# Altium schematic symbol library SCHLIB.SchLib: 2608 symbols (part 3 of 20) (continued)
## CON-FFC-16POS-RA (continued)
footprint CON-FFC-16X1-1MM
pins: 1, 2, 3, 4, 5, 6, 7, 8, 9, 10, 11, 12, 13, 14, 15, 16, 17 27, 18

## CON-FPC-20POS-0.5MM
designator J?, comment 0.5MM
CONN FFC TOP 20POS 0.5MM SMD R/A; Manufacturer: Wurth Electronics; Manufacturer Part Number: 687120183622; Actuator Material: Nylon,Polyamide; Wire/Cable Type: Straight; Number of Positions: 20; Current Rating: 400mA; Supplier 1: Digi-Key; Supplier Part Number 1: 732-11341-1-ND; Stock: 3090; Pricing: 1=2.31, 10=1.93, 100=1.69, 1000=1.54 (USD); RoHS: No; Mount: Surface Mount; Contact Material: Bronze; Contact Plating: Tin; Housing Material: Polymer; Housing Color: Beige; Min Operating Temperature: -25°C; Max Operating Temperature: 85°C; Packaging: Tape and Reel; Termination: Solder; Mating Cycles: 20; Flammability Rating: UL94 V-0; ComponentLink1URL: https://media.digikey.com/pdf/Data%20Sheets/Wurth%20Electronics%20PDFs/WR-FPC_FFC_Flyer.pdf?src-supplier=Digi-Key; ComponentLink1Description: https://media.digikey.com/pdf/Data%20Sheets/Wurth%20Electronics%20PDFs/WR-FPC_FFC_Flyer.pdf?src-supplier=Digi-Key; ComponentLink2URL: https://katalog.we-online.de/em/datasheet/687120183622.pdf?src-supplier=Digi-Key; ComponentLink2Description: https://katalog.we-online.de/em/datasheet/687120183622.pdf?src-supplier=Digi-Key
footprint CON-FPC-20POS-0.5MM (ZIF Connectors, Horizontal, Top Contact Low Profile, pitch 0.5mm, 20p)
pins: 1, 2, 3, 4, 5, 6, 7, 8, 9, 10, 11, 12, 13, 14, 15, 16, 17, 18, 19, 20, MP1, MP2

## CON-FPC-31POS-0.5MM
designator J?, comment 0.5MM
CONN FPC TOP 31POS 0.50MM R/A; Manufacturer: Amphenol FCI; Manufacturer Part Number: SFV31R-4STE1HLF; Actuator Material: Glass,Polyphenylene; Voltage Rating: 50V; Current Rating: 500mA; Number of Positions: 31; Insulation Resistance: 100MR; Pitch: 0.02inch; Supplier 1: Digi-Key; Supplier Part Number 1: SFV31R-4STE1HLF-ND; Stock: 0; Pricing: 6000=0.2513 (USD); RoHS: Yes; Mount: Surface Mount; Housing Material: Polymer; Contact Material: Bronze; Contact Plating: Tin; Min Operating Temperature: -55°C; Max Operating Temperature: 105°C; Package Quantity: 3000; Packaging: Tape and Reel; Termination: Solder; Contact Location: Top; Flammability Rating: UL94 V-0; ComponentLink1URL: https://datasheet.ciiva.com/18563/10117319-18563813.pdf?src-supplier=Digi-Key; ComponentLink1Description: https://datasheet.ciiva.com/18563/10117319-18563813.pdf?src-supplier=Digi-Key
pins: 1, 2, 3, 4, 5, 6, 7, 8, 9, 10, 11, 12, 13, 14, 15, 16, 17, 18, 19, 20, 21, 22, 23, 24, 25, 26, 27, 28, 29, 30, 31, MP1, MP2

## CON-FPC-35POS-0.5MM
designator J?, comment 0.5MM
CONN FFC TOP 35POS 0.50MM R/A; Manufacturer: Amphenol FCI; Manufacturer Part Number: SFV35R-2STBE1HLF; Actuator Material: Glass,Polyphenylene; Number of Positions: 35; Insulation Resistance: 100MR; Wire/Cable Type: Straight; Voltage Rating: 50V; Current Rating: 500mA; Supplier 1: Mouser; Supplier Part Number 1: 649-SFV35R-2STBE1HLF; Stock: 5813; Pricing: 1=0.6, 10=0.443, 100=0.424, 500=0.369, 1000=0.304, 3000=0.277 (USD); RoHS: Yes; Mount: Surface Mount; Contact Material: Bronze; Contact Plating: Gold; Housing Material: Polymer; Min Operating Temperature: -55°C; Max Operating Temperature: 105°C; Termination: Solder; Contact Location: Top; Packaging: Tape and Reel; Number of Rows: 1; Package Quantity: 3000; Orientation: Right Angle; Pitch: 0.5mm; Flammability Rating: UL94 V-0; ComponentLink1URL: https://datasheet.ciiva.com/15249/ecatalogappnamecatdisplaystyledomproductquerynamesfv35r-2stbe1hlf-15249059.pdf?src-supplier=Arrow+Europe; ComponentLink1Description: https://datasheet.ciiva.com/15249/ecatalogappnamecatdisplaystyledomproductquerynamesfv35r-2stbe1hlf-15249059.pdf?src-supplier=Arrow+Europe; ComponentLink2URL: https://datasheet.ciiva.com/48769/sfv12b-hlf-48769990.pdf?src-supplier=Avnet; ComponentLink2Description: https://datasheet.ciiva.com/48769/sfv12b-hlf-48769990.pdf?src-supplier=Avnet
footprint CON-FPC-35POS-0.5mm (FPC Connector, 35-Leads, Right Angle, Pitch 0.5 mm, Mated Height 2.0 mm, SMT)
pins: 1, 2, 3, 4, 5, 6, 7, 8, 9, 10, 11, 12, 13, 14, 15, 16, 17, 18, 19, 20, 21, 22, 23, 24, 25, 26, 27, 28, 29, 30, 31, 32, 33, 34, 35, 36, 37, MP1, MP2

## CON-FPC-39POS-0.3mm
designator J?, comment 39POS
CONN FPC BOTTOM 39POS 0.30MM R/A; Manufacturer: Amphenol FCI; Manufacturer Part Number: 10061122-391420HLF; Actuator Material: Thermoplastic; Number of Contacts: 39; Voltage Rating: 30V; Current Rating: 200mA; Contact Resistance: 100mR; Pitch: 0.3mm; Supplier 1: Digi-Key; Supplier Part Number 1: 609-10061122-391420HLFCT-ND; Stock: 4998; Pricing: 1=0.49, 10=0.461, 25=0.4152, 50=0.3692, 100=0.3537, 250=0.323, 500=0.3076, 1000=0.2538, 2500=0.2307 (USD); RoHS: Yes; Mount: Surface Mount; Housing Color: Black; Contact Material: Copper Alloy; Housing Material: Thermoplastic; Contact Plating: Gold; Min Operating Temperature: -55°C; Max Operating Temperature: 85°C; Orientation: Right Angle; Termination: Solder; Number of Rows: 1; Number of Positions: 39; Packaging: Tape and Reel; Package Quantity: 5000; Length: 13.5mm; Depth: 3.5mm; Radiation Hardening: No; Flammability Rating: UL94 V-0; ComponentLink1URL: https://datasheet.ciiva.com/10369/10061122-10369232.pdf?src-supplier=Avnet; ComponentLink1Description: https://datasheet.ciiva.com/10369/10061122-10369232.pdf?src-supplier=Avnet; ComponentLink2URL: https://datasheet.ciiva.com/18491/10061122-18491997.pdf?src-supplier=Digi-Key; ComponentLink2Description: https://datasheet.ciiva.com/18491/10061122-18491997.pdf?src-supplier=Digi-Key
footprint CON-FPC-39POS-0.3mm (FPC Connector, 39-Leads, Right Angle, Pitch 0.3 mm, Mated Height 0.9 mm, SMT)
pins: 1, 2, 3, 4, 5, 6, 7, 8, 9, 10, 11, 12, 13, 14, 15, 16, 17, 18, 19, 20, 21, 22, 23, 24, 25, 26, 27, 28, 29, 30, 31, 32, 33, 34, 35, 36, 37, 38, 39, MP1, MP2

## CON-FPC-40POS-0.5MM
designator J?, comment 0.5MM
CONN FFC BOTTOM 40POS 0.50MM R/A; Manufacturer: Molex; Manufacturer Part Number: DS1020-09-40VBT1A; Actuator Material: Glass,Polyphenylene; Contact Resistance: 20mR; Current Rating: 500mA; Voltage Rating: 50V; Number of Positions: 40; Wire/Cable Type: Straight; Mating Cycles: 20; Supplier 1: Digi-Key; Supplier Part Number 1: WM3436CT-ND; Stock: 15140; Pricing: 1=2.15, 10=1.954, 25=1.8344, 50=1.7548, 100=1.675, 250=1.5154, 500=1.3958 (USD); RoHS: Yes; Mount: Surface Mount; Contact Material: Bronze; Contact Plating: Gold; Housing Color: Black; Housing Material: Nylon; Min Operating Temperature: -20°C; Max Operating Temperature: 85°C; Number of Rows: 1; Packaging: Tape and Reel; Package Quantity: 1; Termination: Solder; Number of Contacts: 40; Orientation: Right Angle; Length: 25.5mm; Pitch: 0.5mm; Depth: 5.6mm; Flammability Rating: UL94 V-0; ComponentLink1URL: https://datasheet.ciiva.com/671/541323062-sd-671324.pdf?src-supplier=Digi-Key; ComponentLink1Description: https://datasheet.ciiva.com/671/541323062-sd-671324.pdf?src-supplier=Digi-Key; ComponentLink2URL: https://datasheet.ciiva.com/671/541324062-sd-671416.pdf?src-supplier=Digi-Key; ComponentLink2Description: https://datasheet.ciiva.com/671/541324062-sd-671416.pdf?src-supplier=Digi-Key; ComponentLink3URL: https://datasheet.ciiva.com/671/541324062-sd-671417.pdf?src-supplier=Digi-Key; ComponentLink3Description: https://datasheet.ciiva.com/671/541324062-sd-671417.pdf?src-supplier=Digi-Key
footprint CON-FPC-40P-0.5MM (FPC Connector, 40-Leads, Right Angle, Pitch 0.5 mm, Mated Height 2.0 mm, SMT)
pins: 1, 2, 3, 4, 5, 6, 7, 8, 9, 10, 11, 12, 13, 14, 15, 16, 17, 18, 19, 20, 21, 22, 23, 24, 25, 26, 27, 28, 29, 30, 31, 32, 33, 34, 35, 36, 37, 38, 39, 40, MP1, MP2

## CON-HDMI-2086581001
designator J?, comment HDMI  (value not drawn)
CONN RCPT HDMI 19POS SMD R/A; Part Description: 0.5mm Pitch, Surface Mount Right Angle 19 Contacts HDMI Receptacle With Thru Hole Mounting Pads; Manufacturer: MOLEX; Manufacturer Part Number: 2086581001; PressFit: No; Component Kind: Standard; Component Type: Standard; Footprint: MOLEX_47151-0001; Pin Count: 20; Family: HDMI; Mounted: Yes; Socket: No; SMD: Yes; Sense: No; Status: None; ComponentHeight: 6.18mm; Author: CERN DEM JLC
footprint MOLEX_47151-0001
pins: 1 (io), 2 (io), 3 (io), 4 (io), 5 (io), 6 (io), 7 (io), 8 (io), 9 (io), 10 (io), 11 (io), 12 (io), 13 (io), 14 (io), 15 (io), 16 (io), 17 (io), 18 (io), 19 (io), SHIELD (power)

## CON-HEADER 1X7-2.54MM
designator J?, comment 2.54MM
CON HEADER 1X7 2.54MM PITCH; Washability: OK
footprint CON-HEADER-1X7-2.54MM
pins: 1 GND_IN, 2, 3, 4, 5, 6, 7

## CON-HEADER-1X4-2.54MM
designator J?, comment 2.54MM
CON HEADER 1X4 2.54MM PITCH; Washability: OK
footprint CON-HEADER-1X4-2.54MM
pins: 1 GND_IN, 2, 3, 4

## CON-HEADER-24POS-2MM-RA
designator J?, comment 2MM
CONN HEADER R/A 24POS 2MM; Manufacturer: Sullins; Manufacturer Part Number: NRPN401PARN-RC; Connector Type: Male Pin; Number of Positions: 40; Pitch: 0.079inch; Washability: OK; Supplier 1: Digi-Key; Stock 1: 2838; Pricing 1: 1=2,38000, 10=2,13000, 100=1,75390, 500=1,38644, 1000=1,20640 (USD); RoHS: Yes; Mount: Through Hole; Color: Black; Contact Plating: Gold; Package Quantity: 1000; Number of Rows: 1; Packaging: Bulk; Termination: Solder; Contact Mating Length: 0.157inch; ComponentLink1URL: http://www.sullinscorp.com/catalogs/74_PAGE100-101_2mm_MALE_HDR_ST_RA_SMT.pdf?src-supplier=Digi-Key; ComponentLink1Description: http://www.sullinscorp.com/catalogs/74_PAGE100-101_2mm_MALE_HDR_ST_RA_SMT.pdf?src-supplier=Digi-Key; Supplier Part Number 1: S5802-40-ND
footprint CON-HEADER-2MM-20POS-RA
pins: 1, 2, 3, 4, 5, 6, 7, 8, 9, 10, 11, 12, 13, 14, 15, 16, 17, 18, 19, 20, 21, 22, 23, 24

## CON-HEADER-26POS-2.54-FEMALE
designator J?, comment 2.54MM
CONN RCPT .100 26POS TIN T/H; Manufacturer: Samtec; Manufacturer Part Number: SS-126-TT-2; Number of Contacts: 26; Gender: Female; Connector Type: Receptacle; Pitch: 0.1inch; Washability: OK; Supplier 1: Mouser; Stock 1: 0; Pricing 1: 1=2,25000, 10=1,85000, 100=1,39000, 250=1,31000, 500=1,16000, 1000=1,03000 (USD); RoHS: Yes; Mount: Through Hole; Contact Plating: Tin; Contact Material: Copper; Housing Material: Plastic; Color: Black; Housing Color: Black; Number of Rows: 1; Termination: Solder; Packaging: Bulk; Number of Positions: 26; Package Quantity: 1; Length: 66mm; Height: 2.54mm; Width: 2.54mm; Lead Free: Lead Free; ComponentLink1URL: https://datasheet.ciiva.com/413/xsx-mkt1-413530.pdf?src-supplier=Digi-Key; ComponentLink1Description: https://datasheet.ciiva.com/413/xsx-mkt1-413530.pdf?src-supplier=Digi-Key; Supplier Part Number 1: 200-SS126TT2
footprint CON-26POS-FEMALE
pins: 1, 2, 3, 4, 5, 6, 7, 8, 9, 10, 11, 12, 13, 14, 15, 16, 17, 18, 19, 20, 21, 22, 23, 24, 25, 26

## CON-HEADER-32POS-2MM-RA
designator J?, comment 2MM
CONN HEADER R/A 32POS 2MM; Manufacturer: 3M; Manufacturer Part Number: 951126-7622-AR; Gender: Male; Number of Positions: 26; Connector Type: Male Pin; Pitch: 0.079inch; Washability: OK; Supplier 1: Mouser; Stock 1: 0; Pricing 1: 1=1,95000, 10=1,58000, 100=1,51000, 250=1,37000, 500=1,26000, 1000=1,08000 (USD); RoHS: Yes; Mount: Through Hole; Contact Plating: Gold; Color: Black; Number of Rows: 1; Termination: Solder; Package Quantity: 600; Packaging: Bulk; Contact Mating Length: 0.173inch; ComponentLink1URL: https://datasheet.ciiva.com/729/ts2156-729995.pdf?src-supplier=Digi-Key; ComponentLink1Description: https://datasheet.ciiva.com/729/ts2156-729995.pdf?src-supplier=Digi-Key; Supplier Part Number 1: 517-951126-7622-AR
footprint CON-32POS-2MM
pins: 1, 2, 3, 4, 5, 6, 7, 8, 9, 10, 11, 12, 13, 14, 15, 16, 17, 18, 19, 20, 21, 22, 23, 24, 25, 26, 27, 28, 29, 30, 31, 32

## CON-HEADER-40POS-2.54-R/A
designator J?, comment 2.54mm
CONN HEADER R/A 40POS 2.54MM; Manufacturer: Sullins; Manufacturer Part Number: PRPC040SGAN-M71RC; Number of Positions: 40; Connector Type: Male Pin; Pitch: 0.1inch; Washability: OK; Supplier 1: Digi-Key; Stock 1: 1544; Pricing 1: 1=0,97000, 10=0,86500, 100=0,71250, 500=0,56324, 1000=0,49010 (USD); RoHS: Yes; Mount: Through Hole; Color: Black; Contact Plating: Gold; Package Quantity: 1; Number of Rows: 1; Packaging: Bulk; Termination: Solder; Contact Mating Length: 0.318inch; Lead Free: Lead Free; ComponentLink1URL: https://datasheet.ciiva.com/16477/prpc040sgan-m71rc-16477636.pdf?src-supplier=Future+Electronics; ComponentLink1Description: https://datasheet.ciiva.com/16477/prpc040sgan-m71rc-16477636.pdf?src-supplier=Future+Electronics; ComponentLink2URL: https://datasheet.ciiva.com/741/xrxcxxxsxxn-m71rc-11637-b-741405.pdf?src-supplier=Digi-Key; ComponentLink2Description: https://datasheet.ciiva.com/741/xrxcxxxsxxn-m71rc-11637-b-741405.pdf?src-supplier=Digi-Key; Supplier Part Number 1: S1311EC-40-ND
footprint CON-26POS-R/A
pins: 1, 2, 3, 4, 5, 6, 7, 8, 9, 10, 11, 12, 13, 14, 15, 16, 17, 18, 19, 20, 21, 22, 23, 24, 25, 26

## CON-HEADER-40POS-2MM-RA
designator J?, comment 2MM
CONN HEADER R/A 40POS 2MM; Manufacturer: Sullins; Manufacturer Part Number: NRPN401PARN-RC; Connector Type: Male Pin; Number of Positions: 40; Pitch: 0.079inch; Washability: OK; Supplier 1: Digi-Key; Stock 1: 4838; Pricing 1: 1=2,38000, 10=2,13000, 100=1,75390, 500=1,38644, 1000=1,20640 (USD); RoHS: Yes; Mount: Through Hole; Color: Black; Contact Plating: Gold; Package Quantity: 1000; Number of Rows: 1; Packaging: Bulk; Termination: Solder; Contact Mating Length: 0.157inch; ComponentLink1URL: http://www.sullinscorp.com/catalogs/74_PAGE100-101_2mm_MALE_HDR_ST_RA_SMT.pdf?src-supplier=Digi-Key; ComponentLink1Description: http://www.sullinscorp.com/catalogs/74_PAGE100-101_2mm_MALE_HDR_ST_RA_SMT.pdf?src-supplier=Digi-Key; Supplier Part Number 1: S5802-40-ND
footprint CON-HEADER-2MM-40POS-RA
pins: 1, 2, 3, 4, 5, 6, 7, 8, 9, 10, 11, 12, 13, 14, 15, 16, 17, 18, 19, 20, 21, 22, 23, 24, 25, 26, 27, 28, 29, 30, 31, 32, 33, 34, 35, 36, 37, 38, 39, 40

## CON-M50-4302545
designator J?, comment 1.27 MM
CONN RCPT 50POS 0.05 GOLD SMD; Manufacturer: Harwin; Manufacturer Part Number 1: M50-4302545; Number of Contacts: 50; Connector Type: Receptacle; Max Voltage Rating (AC): 500V; Max Current Rating: 1A; Contact Resistance: 20mR; Pitch: 1.27mm; Row Spacing: 0.05inch; Supplier 1: Digi-Key; Stock 1: 410; Pricing 1: 1=6,02000, 10=5,77300, 100=4,76900, 500=4,01600, 1000=3,51400, 5000=3,26300 (USD); RoHS: Yes; Mount: Surface Mount; Contact Plating: Gold; Housing Material: Nylon; Housing Color: Black; Contact Material: Bronze; Color: Black; Min Operating Temperature: -40°C; Max Operating Temperature: 105°C; Termination: Solder; Number of Rows: 2; Number of Positions: 50; Orientation: Straight; Gender: Receptacle; Packaging: Rail/Tube; Current Rating: 1A; Voltage Rating: 500V; Package Quantity: 17; Contact Gender: Female; Length: 35.5mm; Depth: 4.8mm; Radiation Hardening: No; REACH SVHC: No SVHC; ComponentLink1URL: https://datasheet.ciiva.com/11745/0900766b81034f12-11745785.pdf?src-supplier=RSComponents; ComponentLink1Description: https://datasheet.ciiva.com/11745/0900766b81034f12-11745785.pdf?src-supplier=RSComponents; ComponentLink2URL: https://datasheet.ciiva.com/411/m50-430-411355.pdf?src-supplier=Digi-Key; ComponentLink2Description: https://datasheet.ciiva.com/411/m50-430-411355.pdf?src-supplier=Digi-Key; ComponentLink3URL: https://datasheet.ciiva.com/8047/m50-430-8047100.pdf?src-supplier=Element14; ComponentLink3Description: https://datasheet.ciiva.com/8047/m50-430-8047100.pdf?src-supplier=Element14; ComponentLink4URL: https://datasheet.ciiva.com/9480/m50-430-9480351.pdf?src-supplier=Avnet; ComponentLink4Description: https://datasheet.ciiva.com/9480/m50-430-9480351.pdf?src-supplier=Avnet; Supplier Part Number 1: 952-1406-5-ND
footprint CON-M50-4302545
pins: 1, 2, 3, 4, 5, 6, 7, 8, 9, 10, 11, 12, 13, 14, 15, 16, 17, 18, 19, 20, 21, 22, 23, 24, 25, 26, 27, 28, 29, 30, 31, 32, 33, 34, 35, 36, 37, 38, 39, 40, 41, 42, 43, 44, 45, 46, 47, 48, 49, 50, MP1, MP2

## CON-M80-5000000M1-02-331-00-000
designator J?, comment 4MM
CONN HEADER VERT 2POS 4MM; Manufacturer: Harwin; Manufacturer Part Number: M80-5000000M1-02-331-00-000; Number of Contacts: 2; Current Rating: 20A; Voltage Rating: 120V; Gender: Male; Insulation Resistance: 100MR; Connector Type: Power,Male Pin; Contact Resistance: 6mR; Max Voltage Rating (AC): 800V; Washability: OK; Row Spacing: 0.1inch; Supplier 1: Digi-Key; Stock 1: 136; Pricing 1: 1=15.93, 14=14.48, 112=12.30804, 504=10.498, 1008=9.6292 (USD); Mount: Through Hole; Contact Plating: Gold; Color: Black; Contact Material: Brass,Copper Alloy; Housing Material: Polyphenylene; Housing Color: Black; Min Operating Temperature: -55°C; Max Operating Temperature: 125°C; Number of Rows: 1; Termination: Solder; Package Quantity: 1; Packaging: Rail/Tube; Contact Gender: Male; Fastening Type: Threaded; Max Current Rating: 20A; Number of Positions: 2; Orientation: Straight; Length: 18mm; Pitch: 4mm; Depth: 6.05mm; Radiation Hardening: No; REACH SVHC: No SVHC; Flammability Rating: UL94 V-0; ComponentLink1URL: https://cdn.harwin.com/pdfs/Harwin_PC_Datamate.pdf?src-supplier=Digi-Key; ComponentLink1Description: https://cdn.harwin.com/pdfs/Harwin_PC_Datamate.pdf?src-supplier=Digi-Key; ComponentLink2URL: http://www.farnell.com/cad/1499046.pdf?src-supplier=Element14; ComponentLink2Description: http://www.farnell.com/cad/1499046.pdf?src-supplier=Element14; Supplier Part Number 1: 952-1243-ND; Supplier 2: Digi-Key; Stock 2: 321; Pricing 2: 1=1.6, 13=1.45077, 104=1.24317, 507=1.036, 1001=0.888, 5005=0.78736, 10010=0.7696 (USD); Supplier 3: Digi-Key; Stock 3: 226; Pricing 3: 1=2.34, 16=2.11938, 104=1.81654, 504=1.51375, 1000=1.2975, 5000=1.15045 (USD); Supplier 4: Digi-Key; Stock 4: 196; Pricing 4: 1=2.57, 14=2.46714, 105=2.056, 504=1.7476, 1001=1.4906, 5005=1.3364 (USD); Supplier 5: Digi-Key; Manufacturer 5: Harwin; Manufacturer Part Number 5: M50-3930642; Stock 5: 1300; Pricing 5: 1=0,40000, 10=0,37800, 100=0,26460, 500=0,22680, 1000=0,18900, 5000=0,16200, 10000=0,15120 (USD); RoHS: No; Supplier 6: Digi-Key; Supplier Part Number 6: 609-5156-1-ND; Stock: 6320; Pricing: 1=1.41, 10=1.243, 100=1.0728 (USD); Lead Free: Lead Free; ComponentLink3URL: https://datasheet.ciiva.com/9473/89898-9473111.pdf?src-supplier=Avnet; ComponentLink3Description: https://datasheet.ciiva.com/9473/89898-9473111.pdf?src-supplier=Avnet; ComponentLink4URL: https://datasheet.ciiva.com/412/89898-412170.pdf?src-supplier=Digi-Key; ComponentLink4Description: https://datasheet.ciiva.com/412/89898-412170.pdf?src-supplier=Digi-Key; ComponentLink5URL: https://datasheet.ciiva.com/16731/89898-16731623.pdf?src-supplier=Avnet+Europe; ComponentLink5Description: https://datasheet.ciiva.com/16731/89898-16731623.pdf?src-supplier=Avnet+Europe; ComponentLink6URL: https://datasheet.ciiva.com/46428/320508-46428539.pdf?src-supplier=Element14; ComponentLink6Description: https://datasheet.ciiva.com/46428/320508-46428539.pdf?src-supplier=Element14; Supplier Part Number 2: 952-4169-ND; Supplier Part Number 3: 952-4170-ND; Supplier Part Number 4: 952-4171-ND; Supplier Part Number 5: 952-3618-ND
footprint CON-4MM-VERT
pins: 1 GND_IN, 2

## CON-M225-5201046-10POS
designator J?, comment M225-5201046
CONN HDR 2MM 10POS PCB TIN; Manufacturer: Harwin; Washability: OK; Supplier 1: Digi-Key; Supplier Part Number 1: 952-4169-ND; Manufacturer Part Number: M225-5201046; Stock: 256; Pricing: 1=1.6, 10=1.45, 100=1.2432, 500=1.036, 1000=0.888, 5000=0.7874, 10000=0.7696 (USD); RoHS: No; ComponentLink1URL: http://www.farnell.com/datasheets/2723656.pdf?src-supplier=Farnell; ComponentLink1Description: http://www.farnell.com/datasheets/2723656.pdf?src-supplier=Farnell
footprint CON-M225-5201046-10POS
pins: 1 (io), 2 (io), 3 (io), 4 (io), 5 (io), 6 (io), 7 (io), 8 (io), 9 (io), 10 (io)

## CON-M225-5202046-20POS
designator J?, comment M225-5202046
CONN HDR 2MM 20POS PCB TIN; Manufacturer: Harwin; Washability: OK; Supplier 1: Digi-Key; Supplier Part Number 1: 952-4170-ND; Manufacturer Part Number: M225-5202046; Stock: 144; Pricing: 1=2.34, 10=2.119, 100=1.8165, 500=1.5138, 1000=1.2975, 5000=1.1505, 10000=1.1245 (USD); RoHS: No; ComponentLink1URL: http://www.farnell.com/datasheets/2723656.pdf?src-supplier=Farnell; ComponentLink1Description: http://www.farnell.com/datasheets/2723656.pdf?src-supplier=Farnell
footprint CON-M225-5202046-20POS
pins: 1 (io), 2 (io), 3 (io), 4 (io), 5 (io), 6 (io), 7 (io), 8 (io), 9 (io), 10 (io), 11 (io), 12 (io), 13 (io), 14 (io), 15 (io), 16 (io), 17 (io), 18 (io), 19 (io), 20 (io)

## CON-M225-5202646-26POS
designator J?, comment M225-5202646
CONN HDR 2MM 26POS PCB TIN; Manufacturer: Harwin; Washability: OK; Supplier 1: Digi-Key; Supplier Part Number 1: 952-4171-ND; Manufacturer Part Number: M225-5202646; Stock: 154; Pricing: 1=2.57, 10=2.467, 100=2.056, 500=1.7476, 1000=1.4906, 5000=1.3364 (USD); RoHS: No; ComponentLink1URL: http://www.farnell.com/datasheets/2723656.pdf?src-supplier=Farnell; ComponentLink1Description: http://www.farnell.com/datasheets/2723656.pdf?src-supplier=Farnell
footprint CON-M225-5202646-26POS
pins: 1 (io), 2 (io), 3 (io), 4 (io), 5 (io), 6 (io), 7 (io), 8 (io), 9 (io), 10 (io), 11 (io), 12 (io), 13 (io), 14 (io), 15 (io), 16 (io), 17 (io), 18 (io), 19 (io), 20 (io), 21 (io), 22 (io), 23 (io), 24 (io), 25 (io), 26 (io)

## CON-M225-5203446-34POS
designator J?, comment 2MM
CONN HDR 2MM 34POS PCB TIN; Manufacturer: Harwin; Manufacturer Part Number: M225-5203446; Washability: OK; Supplier 1: Digi-Key; Stock 1: 162; Pricing 1: 1=3.12, 12=2.9925, 102=2.49402, 504=2.1199, 1002=1.80815, 5004=1.6211 (USD); Supplier Part Number 1: 952-4172-ND
footprint CON-M225-520344634POS
pins: 1 (io), 2 (io), 3 (io), 4 (io), 5 (io), 6 (io), 7 (io), 8 (io), 9 (io), 10 (io), 11 (io), 12 (io), 13 (io), 14 (io), 15 (io), 16 (io), 17 (io), 18 (io), 19 (io), 20 (io), 21 (io), 22 (io), 23 (io), 24 (io), 25 (io), 26 (io), 27 (io), 28 (io), 29 (io), 30 (io), 31 (io), 32 (io), 33 (io), 34 (io)

## CON-M225-5205046-50POS
designator J?, comment 2MM
CONN HDR 2MM 50POS PCB TIN; Manufacturer: Harwin; Manufacturer Part Number: M225-5205046; Washability: OK; Supplier 1: Digi-Key; Stock 1: 137; Pricing 1: 1=4.21, 12=4.04167, 100=3.368, 500=2.8628, 1000=2.4418 (USD); Supplier Part Number 1: 952-4173-ND
footprint CON-M225-5205046-50POS
pins: 1 (io), 2 (io), 3 (io), 4 (io), 5 (io), 6 (io), 7 (io), 8 (io), 9 (io), 10 (io), 11 (io), 12 (io), 13 (io), 14 (io), 15 (io), 16 (io), 17 (io), 18 (io), 19 (io), 20 (io), 21 (io), 22 (io), 23 (io), 24 (io), 25 (io), 26 (io), 27 (io), 28 (io), 29 (io), 30 (io), 31 (io), 32 (io), 33 (io), 34 (io), 35 (io), 36 (io), 37 (io), 38 (io), 39 (io), 40 (io), 41 (io), 42 (io), 43 (io), 44 (io), 45 (io), 46 (io), 47 (io), 48 (io), 49 (io), 50 (io)

## CON-M225-5205046-50POS-V1
designator J?, comment 2MM
CONN HDR 2MM 50POS PCB TIN; Manufacturer: Harwin; Manufacturer Part Number: M225-5205046; Washability: OK; Supplier 1: Digi-Key; Stock 1: 137; Pricing 1: 1=4.21, 12=4.04167, 100=3.368, 500=2.8628, 1000=2.4418 (USD); Supplier Part Number 1: 952-4173-ND
footprint CON-M225-5205046-50POS
pins: 1 (io), 2 (io), 3 (io), 4 (io), 5 (io), 6 (io), 7 (io), 8 (io), 9 (io), 10 (io), 11 (io), 12 (io), 13 (io), 14 (io), 15 (io), 16 (io), 17 (io), 18 (io), 19 (io), 20 (io), 21 (io), 22 (io), 23 (io), 24 (io), 25 (io), 26 (io), 27 (io), 28 (io), 29 (io), 30 (io), 31 (io), 32 (io), 33 (io), 34 (io), 35 (io), 36 (io), 37 (io), 38 (io), 39 (io), 40 (io), 41 (io), 42 (io), 43 (io), 44 (io), 45 (io), 46 (io), 47 (io), 48 (io), 49 (io), 50 (io)

## CON-M300-MV10345M1
designator J?, comment 3MM
CONN HEADER VERT 3POS 3MM; Manufacturer: Harwin; Manufacturer Part Number: M300-MV10345M1; Number of Positions: 3; Gender: Male; Connector Type: Power,Male Pin; Pitch: 0.118inch; Washability: OK; Supplier 1: Digi-Key; Stock 1: 778; Pricing 1: 1=5, 12=4.795, 108=3.99602, 504=3.39661, 1008=2.8971 (USD); Mount: Through Hole; Number of Pins: 3; Color: Green; Contact Plating: Gold; Contact Material: Brass; Packaging: Rail/Tube; Number of Rows: 1; Termination: Solder; Fastening Type: Threaded; Number of Contacts: 3; REACH SVHC: No SVHC; Supplier Part Number 1: 952-2522-5-ND
footprint CON-M300-MV10345M1
pins: 1 GND_IN, 2, 3

## CON-OSTYK51102030
designator J?  Pitch: 9.5mm  Mount: TH  (hidden comment: *)
CONN BARRIER STRIP 2CIRC 0.374"; Manufacturer: On-Shore Technology; Manufacturer Part Number: OSTYK51102030; Voltage Rating: 300V; Number of Circuits: 2; Wire Gauge (Max): 22AWG; Wire Gauge (Min): 10AWG; Current Rating: 30A; Washability: OK; Supplier 1: Digi-Key; Stock 1: 7444; Pricing 1: 1=1, 10=0.702, 25=0.6548, 50=0.5944, 100=0.5918, 250=0.49972, 500=0.4734, 1000=0.4208, 5000=0.3419 (USD); Colour: Black; Insulation Material: Nylon; Min Operating Temperature: -40°C; Max Operating Temperature: 115°C; Number of Rows: 1; Packaging: Bulk; Number of Wire Entries: 2; Flammability Rating: UL94 V-0; ComponentLink1URL: http://www.on-shore.com/wp-content/uploads/2015/09/ostyk511xx030.pdf; ComponentLink1Description: http://www.on-shore.com/wp-content/uploads/2015/09/ostyk511xx030.pdf; Supplier Part Number 1: ED2953-ND
pins: 1 GND_IN, 2

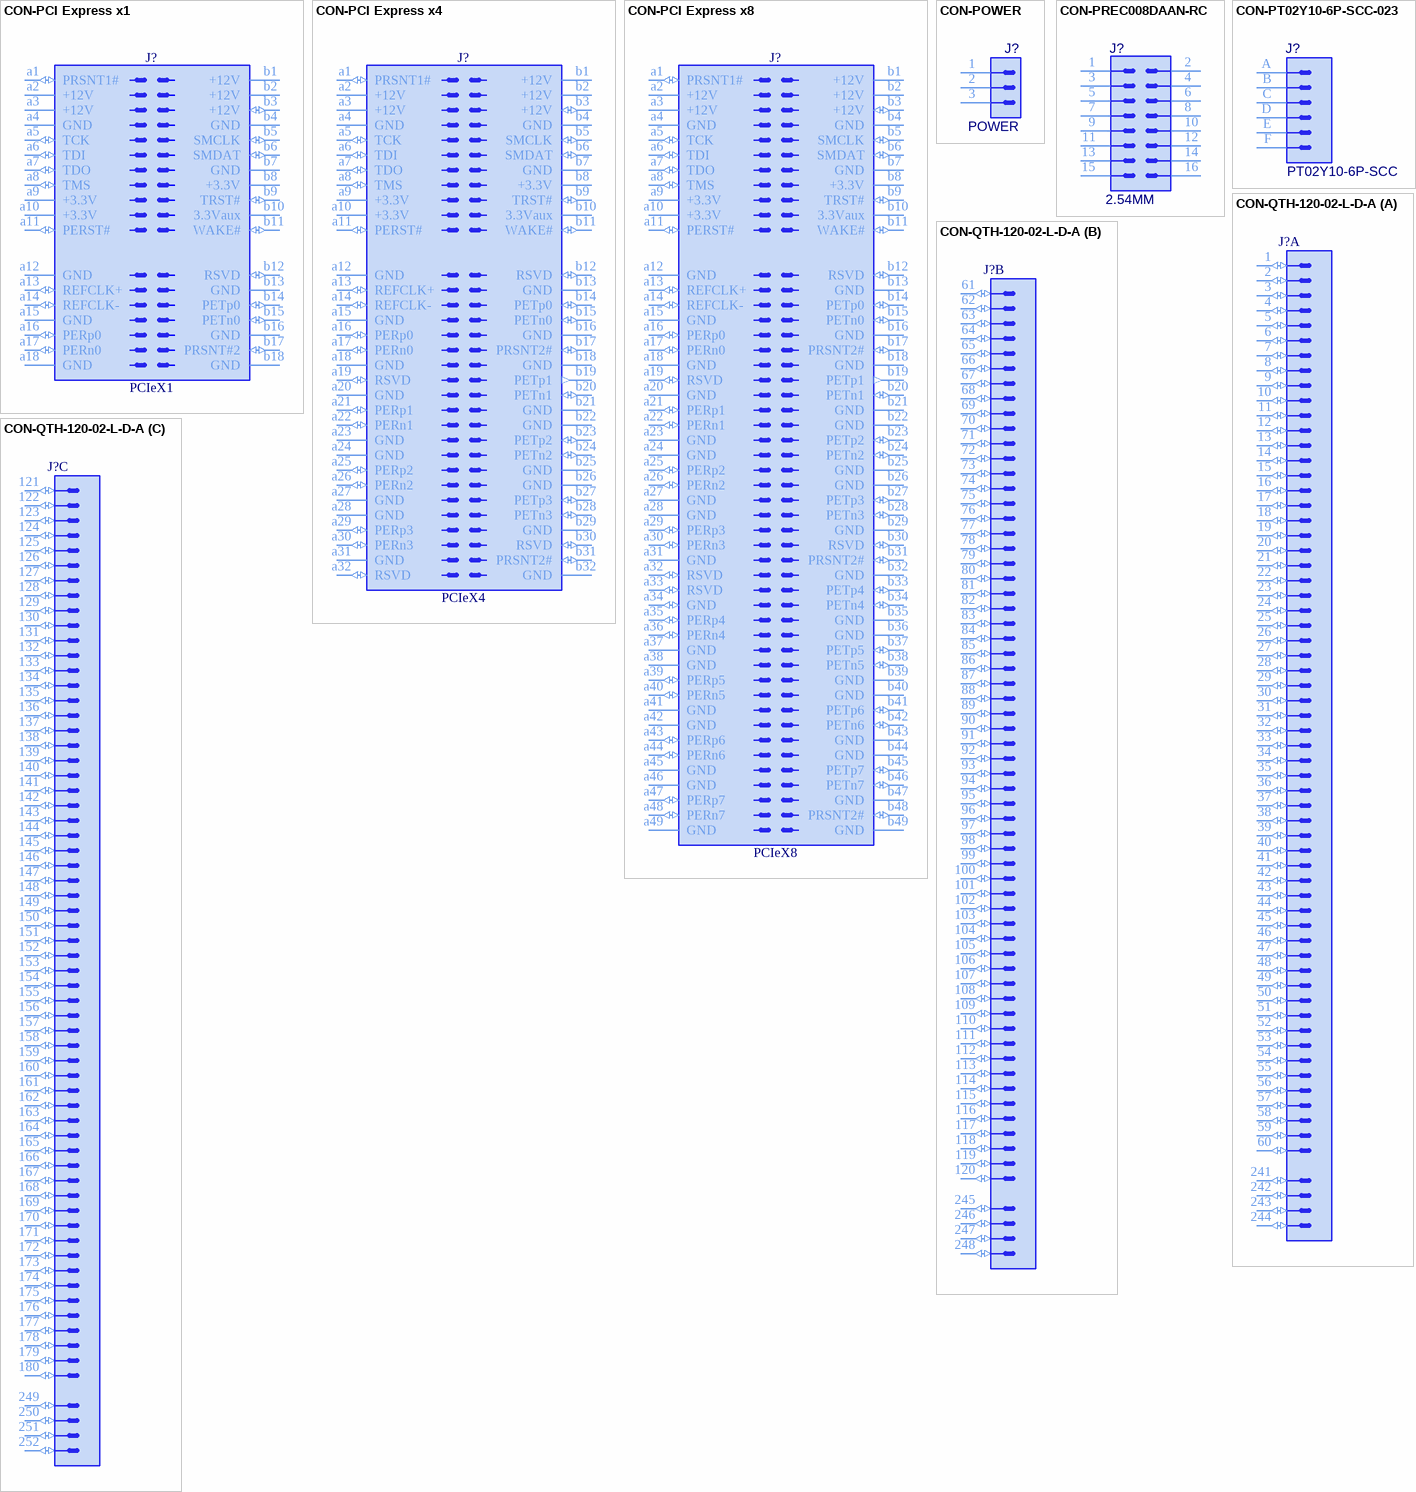
[diagram p9: symbols CON-PCI Express x1 to CON-QTH-120-02-L-D-A]

## CON-PCI Express x1
designator J?, comment PCIeX1
36 contacts Board Eddge PCI Express x1 Connector; Part Description: 36 contacts Board Edge PCI Express x1 Connector; Manufacturer: PCI-SIG; Mounted: No; PressFit: No; Part Number: PCI Express x1; Component Kind: Standard (No BOM); Component Type: Standard (No BOM); Footprint: PCI Express x1; Pin Count: 36; Family: PCI Express x1; Socket: No; SMD: No; Sense: No; Status: None; ComponentHeight: 0mm
footprint PCI Express x1
pins: a1 PRSNT1# (io), a2 +12V (power), a3 +12V (power), a4 GND (power), a5 TCK (io), a6 TDI (io), a7 TDO (io), a8 TMS (io), a9 +3.3V (power), a10 +3.3V (power), a11 PERST# (io), a12 GND (power), a13 REFCLK+ (io), a14 REFCLK- (io), a15 GND (power), a16 PERp0 (io), a17 PERn0 (io), a18 GND (power), b1 +12V (power), b2 +12V (power), b3 +12V (io), b4 GND (power), b5 SMCLK (io), b6 SMDAT (io), b7 GND (power), b8 +3.3V (power), b9 TRST# (io), b10 3.3Vaux (power), b11 WAKE# (io), b12 RSVD (io), b13 GND (power), b14 PETp0 (io), b15 PETn0 (io), b16 GND (power), b17 PRSNT#2 (io), b18 GND (power)

## CON-PCI Express x4
designator J?, comment PCIeX4
64 contacts Board Eddge PCI Express x4 Connector; Part Description: 64 contacts Board Edge PCI Express x4 Connector; Manufacturer: PCI-SIG; Mounted: No; PressFit: No; Part Number: PCI Express x4; Component Kind: Standard (No BOM); Component Type: Standard (No BOM); Footprint: PCI Express x4; Pin Count: 64; Family: PCI Express x4; Socket: No; SMD: No; Sense: No; Status: None; ComponentHeight: 0mm
footprint PCI Express x4
pins: a1 PRSNT1# (io), a2 +12V (power), a3 +12V (power), a4 GND (power), a5 TCK (io), a6 TDI (io), a7 TDO (io), a8 TMS (io), a9 +3.3V (power), a10 +3.3V (power), a11 PERST# (io), a12 GND (power), a13 REFCLK+ (io), a14 REFCLK- (io), a15 GND (power), a16 PERp0 (io), a17 PERn0 (io), a18 GND (power), a19 RSVD (io), a20 GND (power), a21 PERp1 (io), a22 PERn1 (io), a23 GND (power), a24 GND (power), a25 PERp2 (io), a26 PERn2 (io), a27 GND (power), a28 GND (power), a29 PERp3 (io), a30 PERn3 (io), a31 GND (power), a32 RSVD (io), b1 +12V (power), b2 +12V (power), b3 +12V (io), b4 GND (power), b5 SMCLK (io), b6 SMDAT (io), b7 GND (power), b8 +3.3V (power), b9 TRST# (io), b10 3.3Vaux (power), b11 WAKE# (io), b12 RSVD (io), b13 GND (power), b14 PETp0 (io), b15 PETn0 (io), b16 GND (power), b17 PRSNT2# (io), b18 GND (power), b19 PETp1 (out), b20 PETn1 (io), b21 GND (power), b22 GND (power), b23 PETp2 (io), b24 PETn2 (io), b25 GND (power), b26 GND (power), b27 PETp3 (io), b28 PETn3 (io), b29 GND (power), b30 RSVD (io), b31 PRSNT2# (io), b32 GND (power)

## CON-PCI Express x8
designator J?, comment PCIeX8
98 contacts Board Eddge PCI Express x8 Connector; Part Description: 98 contacts Board Edge PCI Express x8 Connector; Manufacturer: PCI-SIG; Mounted: No; PressFit: No; Part Number: PCI Express x8; Component Kind: Standard (No BOM); Component Type: Standard (No BOM); Footprint: PCI Express x8; Pin Count: 98; Family: PCI Express x8; Socket: No; SMD: No; Sense: No; Status: None; ComponentHeight: 0mm
footprint PCI Express x8
pins: a1 PRSNT1# (io), a2 +12V (power), a3 +12V (power), a4 GND (power), a5 TCK (io), a6 TDI (io), a7 TDO (io), a8 TMS (io), a9 +3.3V (power), a10 +3.3V (power), a11 PERST# (io), a12 GND (power), a13 REFCLK+ (io), a14 REFCLK- (io), a15 GND (power), a16 PERp0 (io), a17 PERn0 (io), a18 GND (power), a19 RSVD (io), a20 GND (power), a21 PERp1 (io), a22 PERn1 (io), a23 GND (power), a24 GND (power), a25 PERp2 (io), a26 PERn2 (io), a27 GND (power), a28 GND (power), a29 PERp3 (io), a30 PERn3 (io), a31 GND (power), a32 RSVD (io), a33 RSVD (io), a34 GND (io), a35 PERp4 (io), a36 PERn4 (io), a37 GND (power), a38 GND (power), a39 PERp5 (io), a40 PERn5 (io), a41 GND (power), a42 GND (power), a43 PERp6 (io), a44 PERn6 (io), a45 GND (power), a46 GND (power), a47 PERp7 (io), a48 PERn7 (io), a49 GND (power), b1 +12V (power), b2 +12V (power), b3 +12V (io), b4 GND (power), b5 SMCLK (io), b6 SMDAT (io), b7 GND (power), b8 +3.3V (power), b9 TRST# (io), b10 3.3Vaux (power), b11 WAKE# (io), b12 RSVD (io), b13 GND (power), b14 PETp0 (io), b15 PETn0 (io), b16 GND (power), b17 PRSNT2# (io), b18 GND (power), b19 PETp1 (out), b20 PETn1 (io), b21 GND (power), b22 GND (power), b23 PETp2 (io), b24 PETn2 (io), b25 GND (power), b26 GND (power), b27 PETp3 (io), b28 PETn3 (io), b29 GND (power), b30 RSVD (io), b31 PRSNT2# (io), b32 GND (power), b33 PETp4 (io), b34 PETn4 (io), b35 GND (power), b36 GND (power), b37 PETp5 (io), b38 PETn5 (io), b39 GND (power), b40 GND (power), b41 PETp6 (io), b42 PETn6 (io), b43 GND (power), b44 GND (power), b45 PETp7 (io), b46 PETn7 (io), b47 GND (power), b48 PRSNT2# (io), b49 GND (power)